# Altium footprint library X98_CARRIER_V1R2_12082022.PcbLib: 104 footprints (part 3 of 7)
Each footprint in its own frame and in the unit in brackets; x right, y up, seen from the top. Pads: shape width x height; smd on the part's side, far side on the other; paste and mask are expansions set on the pad; w line width, h text height; cw(c..) or ccw(c..) is an arc to the next point about the centre after c.
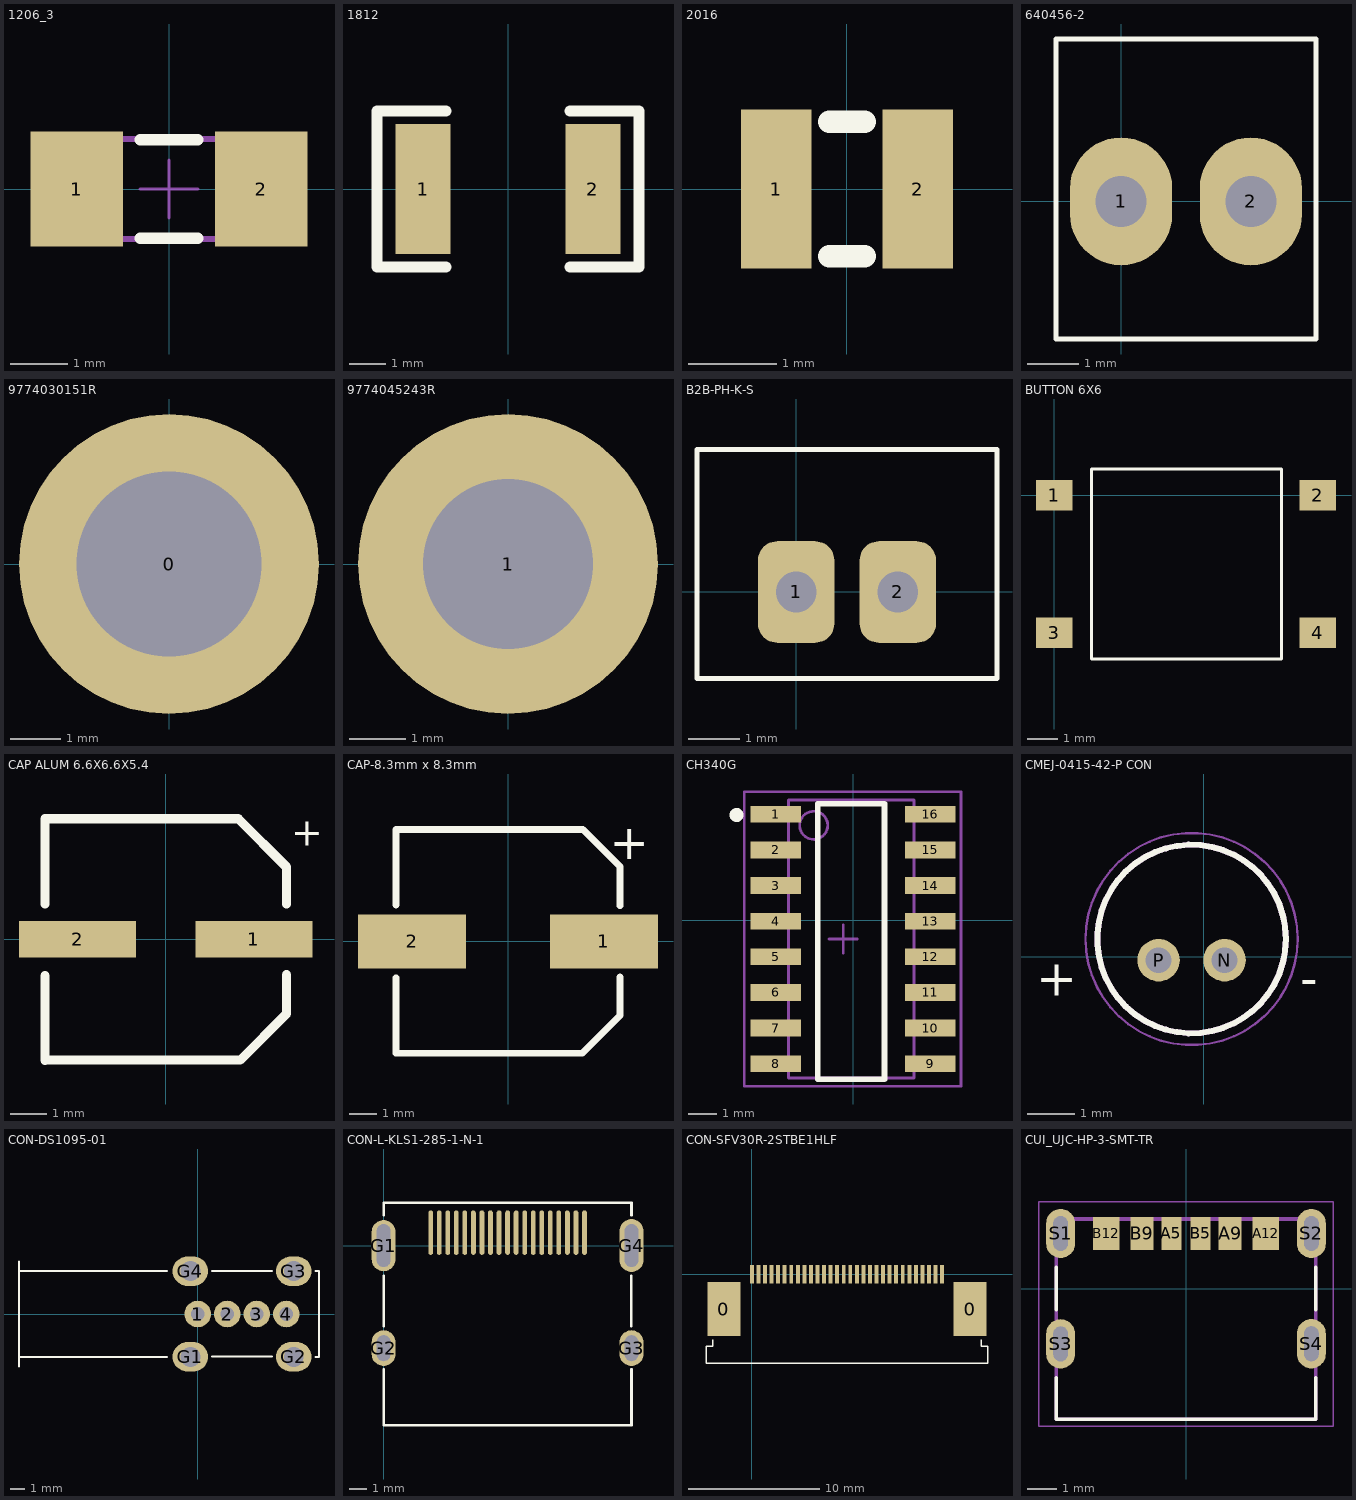
[diagram p2: the footprints below, top view; thin cyan lines are the x and y axes]

## 1206_3 [mm]
pads (2):
  rect 1.6x2 smd mask+0.025: 1(-1.6,0) 2(1.6,0)
Top Overlay:
  lines w0.2: -0.5,-0.85 0.5,-0.85 ; -0.5,0.85 0.5,0.85
Mechanical 12:
  lines w0.001: -1.725,-0.865 -1.725,0.865 1.725,0.865 1.725,-0.865 -1.725,-0.865
Mechanical 13:
  lines w0.1: -1.725,-0.865 -1.725,0.865 1.725,0.865 1.725,-0.865 -1.725,-0.865
Mechanical 15:
  lines w0.05: -0.5,0 0.5,0 ; 0,-0.5 0,0.5
3D body "User Library-1206(3216M) Res.STEP": height 1.53, standoff 0, extent -2,-0.8 2,0.8

## 1812 [mil] "Chip 1812, 2-Leads, Body 4.2 x 2.5mm"
pads (2):
  rect 60x141.73 smd: 1(-92.5,0) 2(92.5,0)
Top Overlay:
  lines w12: -67.5,-85 -142.5,-85 -142.5,85 -67.5,85 ; 67.5,-85 142.5,-85 142.5,85 67.5,85
3D body "User Library-Fuse 1812.STEP": height -15.75, standoff -56.5, extent -94,-69 92.42,68.01

## 2016 [mm]
pads (2):
  rect 0.8x1.8 smd mask+0.051: 1(-0.8,0) 2(0.8,0)
Top Overlay:
  lines w0.254: -0.2,-0.762 0.2,-0.762 ; -0.2,0.762 0.2,0.762
3D body "74479776215.stp": height 1.04, standoff 0.04, extent -1,-0.8 1,0.8

## 640456-2 [mm]
pads (2):
  oval 2x2.5 hole 1: 1(0,0) 2(2.54,0)
Top Overlay:
  lines w0.102: -1.27,3.175 3.81,3.175 3.81,-2.692 -1.27,-2.692 ; -1.27,-2.692 -1.27,3.15 -1.27,-2.692
3D body "c-640456-2-aa-3d.stp": height 9.99, standoff -3.6, extent -1.295,-2.692 3.785,3.15

## 9774030151R [mm]
pads (1):
  round 6 / inner round 6 / far side oval 5x4.7 hole 3.7 mask+0: 0(0,0)
Top Paste:
  lines w1: -2.248,0.84 cw(c0,0) -0.887,2.23 ; -2.239,-0.865 ccw(c0,0) -0.862,-2.24 ; 0.871,-2.236 ccw(c0,0) 2.248,-0.84 ; 0.873,2.236 cw(c0,0) 2.23,0.886
3D body "9774030151R (rev1).stp": height 3, standoff -1.4, extent -2.55,-2.547 2.55,2.547

## 9774045243R [mm]
pads (1):
  round 5.3 hole 3 mask+0: 1(0,0)
Top Paste:
  lines w1.15: -1.945,-0.657 cw(c-0.004,0.002) -1.848,0.898 ; -0.949,-1.823 ccw(c-0.002,-0.004) 0.836,-1.875 ; -0.642,1.951 cw(c0.002,0.004) 0.73,1.921 ; 1.859,-0.876 ccw(c0.004,-0.002) 1.963,0.602
3D body "9774045243R (rev1).stp": height 4.5, standoff -1.4, extent -2.175,-2.163 2.175,2.163

## B2B-PH-K-S [mm] "2MM 2POS VERT JST"
pads (2):
  rrect50% 1.5x2 hole 0.8 mask+0.051: 1(0,0) 2(2,0)
Top Overlay:
  lines w0.102: -1.95,-1.7 3.95,-1.7 3.95,2.8 ; -1.95,-1.676 -1.95,2.8 ; -1.946,2.8 3.946,2.8
3D body "User Library-b2b-ph-ks-1.STEP": height 6.2, standoff -2.8, extent -1.925,-1.681 3.975,2.819

## BUTTON 6X6 [mm]
height 8.5
pads (4):
  rect 1.2x1 smd mask+0.051: 1(0,0) 2(8.6,0) 3(0,-4.5) 4(8.6,-4.5)
Top Overlay:
  lines w0.102: 1.217,-5.35 1.217,0.85 7.417,0.85 7.417,-5.35 1.217,-5.35
3D body "User Library-KFC-A06-HA-4_3.STEP": height 4.3, standoff 0, extent -0.179,-5.273 8.821,0.727

## CAP ALUM 6.6X6.6X5.4 [mm]
pads (2):
  rect 3.2x1 smd: 1(2.413,0) 2(-2.413,0)
Top Overlay:
  lines w0.25: -3.3,-0.991 -3.302,-3.302 2.035,-3.3 3.301,-2.032 3.3,-0.965 ; -3.3,0.965 -3.302,3.302 1.651,3.3 ; 1.6,3.302 1.982,3.302 3.301,1.981 3.3,0.965
  text "+" at 3.429,2.565 h0.76
3D body "User Library-CAP SMD SVP 6_3x5_9.STEP": height 5.9, standoff 0, extent -3.625,-3.302 3.675,3.298

## CAP-8.3mm x 8.3mm [mm]
height 10.2
pads (2):
  rect 4x2 smd: 1(3.55,0) 2(-3.55,0)
Top Overlay:
  lines w0.25: -4.14,-1.346 -4.14,-4.14 2.743,-4.14 4.14,-2.743 4.14,-1.321 ; -4.14,1.346 -4.14,4.14 2.769,4.14 4.14,2.769 4.14,1.321
  text "+" at 3.759,3.048 h1.27
3D body "User Library-ALU-F.STEP": height 10.2, standoff 0, extent -5.004,-4.14 4.896,4.16

## CH340G [mm]
pads (16):
  rect 1.8x0.6 smd: 1(-2.752,3.779) 2(-2.752,2.509) 3(-2.752,1.239) 4(-2.752,-0.031) 5(-2.752,-1.301) 6(-2.752,-2.571) 7(-2.752,-3.841) 8(-2.752,-5.111) 9(2.748,-5.111) 10(2.748,-3.841) 11(2.748,-2.571) 12(2.748,-1.301) 13(2.748,-0.031) 14(2.748,1.239) 15(2.748,2.509) 16(2.748,3.779)
Top Overlay:
  circle w0.25: c-4.153,3.752 r0.125
  lines w0.2: -1.252,-5.666 -1.252,4.153 1.123,4.153 1.123,-5.666 -1.252,-5.666
Mechanical 13:
  circle w0.1: c-1.402,3.384 r0.5
  lines w0.1: -2.302,-5.616 -2.302,4.284 2.173,4.284 2.173,-5.616 -2.302,-5.616
Mechanical 15:
  lines w0.1: -0.852,-0.666 0.148,-0.666 ; -0.352,-1.166 -0.352,-0.166 ; -3.877,-5.916 -3.877,4.584 3.848,4.584 3.848,-5.916 -3.877,-5.916
3D body: height 1.75, standoff 0, extent -2.302,-5.621 2.173,4.284

## CMEJ-0415-42-P CON [mm] "CMEJ-0415-42-P"
pads (2):
  round 0.9 hole 0.55: N(0.446,-0.069) P(-0.954,-0.069)
Top Overlay:
  circle w0.127: c-0.254,0.381 r2
  text "-" at 2.046,-0.819 h0.76
  text "+" at -3.554,-0.819 h0.76
Mechanical 13:
  circle w0.127: c-0.254,0.381 r2
  text "-" at 2.046,-0.819 h0.76
  text "+" at -3.554,-0.819 h0.76
Mechanical 15:
  circle w0.05: c-0.254,0.381 r2.25
3D body "CUI_DEVICES_CMEJ-0415-42-P.step": height 1.76, standoff -1.78, extent -2.254,-1.651 1.746,2.349

## CON-DS1095-01 [mm]
pads (8):
  round 1.8 hole 0.92: 1(0,0) 2(2,0) 3(4,0) 4(6,0)
  oval 2.4x2 hole 1.35: G1(-0.5,-2.9) G2(6.5,-2.9) G3(6.5,2.9) G4(-0.5,2.9)
Top Overlay:
  lines w0.127: -12.09,-3.56 -12.09,3.56 ; -12.09,-2.9 -2.08,-2.9 ; -12.09,2.9 -2.08,2.9 ; 0.968,-2.879 5.032,-2.879 ; 0.968,2.921 5.032,2.921 ; 7.953,-2.921 8.207,-2.921 8.207,2.921 7.953,2.921
3D body "ds1095-01_asm_7_asm.stp": height 14.96, standoff -2.75, extent -12.061,-3.683 7.139,3.515

## CON-L-KLS1-285-1-N-1 [mm]
pads (23):
  oval 0.28x2.6 smd: 1(11.75,0.759) 2(11.25,0.759) 3(10.75,0.759) 4(10.25,0.759) 5(9.75,0.759) 6(9.25,0.759) 7(8.75,0.759) 8(8.25,0.759) 9(7.75,0.759) 10(7.25,0.759) 11(6.75,0.759) 12(6.25,0.759) 13(5.75,0.759) 14(5.25,0.759) 15(4.75,0.759) 16(4.25,0.759) 17(3.75,0.759) 18(3.25,0.759) 19(2.75,0.759)
  oval 1.4x3 hole 0.8 slot 2.5 at 90 deg: G1(0,0)
  oval 1.4x2.1 hole 0.8 slot 1.5 at 90 deg: G2(0,-6) G3(14.5,-6)
  oval 1.4x3.1 hole 0.8 slot 2.5 at 90 deg: G4(14.5,0)
Top Overlay:
  lines w0.152: 0,-7.239 0,-10.5 14.5,-10.5 14.5,-7.239 ; 0,-4.699 0,-1.778 ; 0,1.778 0,2.5 14.5,2.5 14.5,1.778 ; 14.478,-4.699 14.478,-1.778
3D body "L-KLS1-285-1-N-1-R   01338.stp": height 6.28, standoff -1.35, extent -0.24,-10.47 14.76,1.68

## CON-SFV30R-2STBE1HLF [mm]
pads (32):
  rect 2.5x4.1 smd mask+0.051: 0(-2.136,-2.66) 0(16.636,-2.66)
  rect 0.3x1.4 smd mask+0.05: 1(-0.003,-0.001) 2(0.5,0) 3(1,0) 4(1.5,0) 5(2,0) 6(2.5,0) 7(3,0) 8(3.5,0) 9(4,0) 10(4.5,0) 11(5,0) 12(5.5,0) 13(6,0) 14(6.5,0) 15(7,0) 16(7.5,0) 17(8,0) 18(8.5,0) 19(9,0) 20(9.5,0) 21(10,0) 22(10.5,0) 23(11,0) 24(11.5,0) 25(12,0) 26(12.5,0) 27(13,0) 28(13.5,0) 29(14,0) 30(14.5,0)
Top Overlay:
  lines w0.102: -3,-5 -3,-5.5 -3.5,-5.5 -3.5,-6.775 17.977,-6.775 17.977,-5.5 17.495,-5.5 17.495,-4.997
3D body "ssfv30r_2stlf.stp": height 1.92, standoff 0.05, extent -3,-4.45 17.5,0.45

## CUI_UJC-HP-3-SMT-TR [mm]
pads (10):
  rect 0.7x1.15 smd: A5(-0.5,1.903) B5(0.5,1.903)
  rect 0.8x1.15 smd: A9(1.52,1.903) B9(-1.52,1.903)
  rect 0.9x1.15 smd: A12(2.75,1.903) B12(-2.75,1.903)
  oval 1x1.7 hole 0.5 slot 1.2 at 90 deg mask+0.051: S1(-4.32,1.903) S2(4.32,1.903) S3(-4.32,-1.903) S4(4.32,-1.897)
Top Overlay:
  lines w0.127: -4.47,-3.067 -4.47,-4.497 4.47,-4.497 4.47,-3.067 ; -4.47,-0.727 -4.47,0.733 ; 4.47,-0.727 4.47,0.733
Mechanical 13:
  lines w0.127: -4.47,-4.497 -4.47,2.402 4.47,2.402 4.47,-4.497 -4.47,-4.497
Mechanical 15:
  lines w0.05: -5.07,-4.747 -5.07,3.003 5.07,3.003 5.07,-4.747 -5.07,-4.747
3D body "CUI_DEVICES_UJC-HP-3-SMT-TR.step": height 3.25, standoff -1.01, extent -4.47,-4.32 4.47,2.58